# Altium footprint library UWRT_Footprint_Library_2020.PcbLib: 376 footprints (part 23 of 24)
Each footprint in its own frame and in the unit in brackets; x right, y up, seen from the top. Pads: shape width x height; smd on the part's side, far side on the other; paste and mask are expansions set on the pad; w line width, h text height; cw(c..) or ccw(c..) is an arc to the next point about the centre after c.
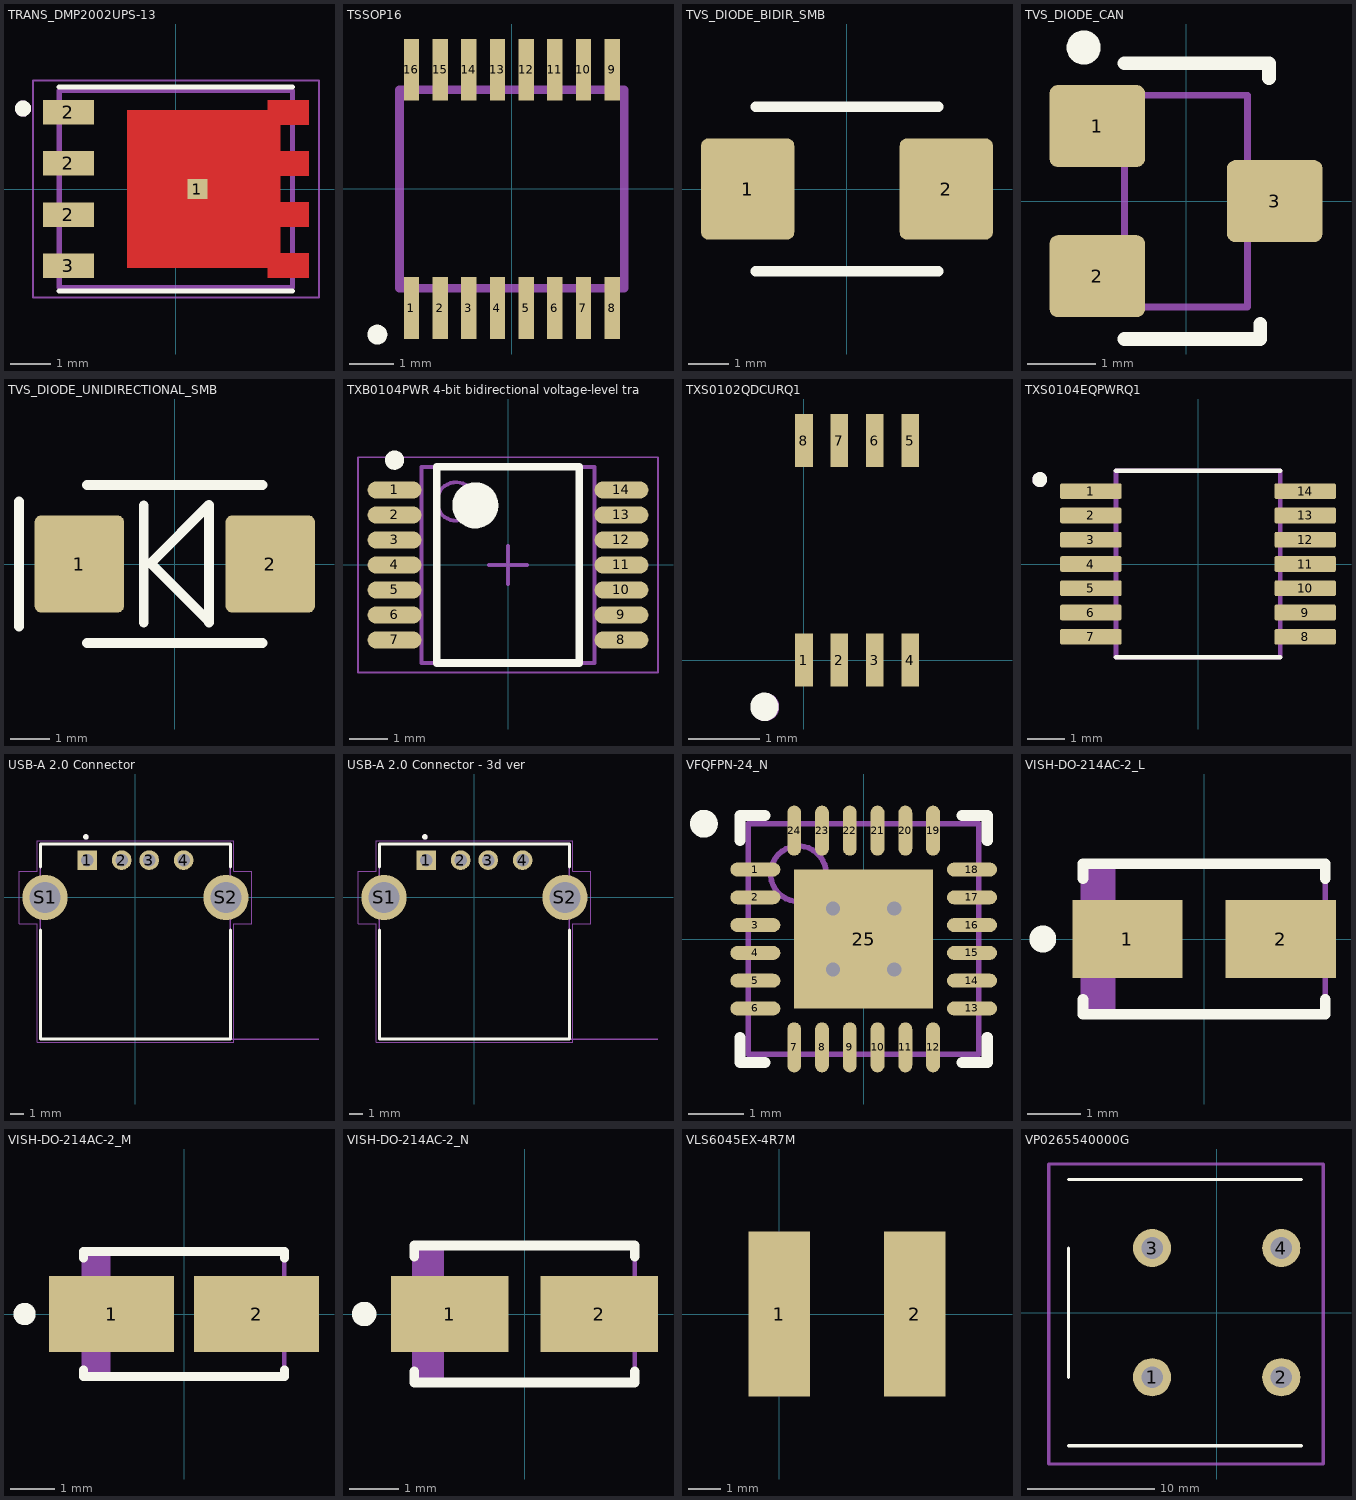
[diagram p22: the footprints below, top view; thin cyan lines are the x and y axes]

## TRANS_DMP2002UPS-13 [mm]
pads (5):
  rect 0.5x0.5 smd paste-1 mask+0: 1(0.535,0)
  rect 1.27x0.61 smd: 2(-2.67,-0.635) 2(-2.67,0.635) 2(-2.67,1.905) 3(-2.67,-1.905)
Top Layer:
  region: 3.305,1.6 2.595,1.6 2.595,0.94 3.305,0.94 3.305,0.33 2.595,0.33 2.595,-0.33 3.305,-0.33 3.305,-0.94 2.595,-0.94 2.595,-1.6 3.305,-1.6 3.305,-2.21 2.285,-2.21 2.285,-1.955 -1.215,-1.955 -1.215,1.955 2.285,1.955 2.285,2.21 3.305,2.21
Top Overlay:
  circle w0.2: c-3.8,2 r0.1
  lines w0.127: -2.9,-2.53 2.9,-2.53 ; -2.9,2.53 2.9,2.53
Top Paste:
  region: 1.64,-1.235 -0.57,-1.235 -0.57,1.235 1.64,1.235
  region: 3.305,1.6 2.6,1.6 2.6,2.21 3.305,2.21
  region: 3.305,0.33 2.6,0.33 2.6,0.94 3.305,0.94
  region: 3.305,-0.94 2.6,-0.94 2.6,-0.33 3.305,-0.33
  region: 3.305,-2.21 2.6,-2.21 2.6,-1.6 3.305,-1.6
Top Solder:
  region: 3.405,1.5 2.695,1.5 2.695,1.04 3.405,1.04 3.405,0.23 2.695,0.23 2.695,-0.23 3.405,-0.23 3.405,-1.04 2.695,-1.04 2.695,-1.5 3.405,-1.5 3.405,-2.31 2.185,-2.31 2.185,-2.055 -1.315,-2.055 -1.315,2.055 2.185,2.055 2.185,2.31 3.405,2.31
Mechanical 13:
  circle w0.2: c-3.8,2 r0.1
  lines w0.127: -2.9,-2.45 -2.9,2.45 2.9,2.45 2.9,-2.45 -2.9,-2.45
Mechanical 15:
  lines w0.05: -3.555,-2.7 3.555,-2.7 3.555,2.7 -3.555,2.7 -3.555,-2.7
3D body "SOIC8_SG_4P9X3P9MC.step": height 1.75, standoff 0, extent -3.048,-2.451 3.15,2.451

## TSSOP16 [mm]
pads (16):
  rect 0.35x1.4 smd: 1(-2.275,-2.7) 2(-1.625,-2.7) 3(-0.975,-2.7) 4(-0.325,-2.7) 5(0.325,-2.7) 6(0.975,-2.7) 7(1.625,-2.7) 8(2.275,-2.7) 9(2.275,2.7) 10(1.625,2.7) 11(0.975,2.7) 12(0.325,2.7) 13(-0.325,2.7) 14(-0.975,2.7) 15(-1.625,2.7) 16(-2.275,2.7)
Top Overlay:
  circle w0.25: c-3.048,-3.302 r0.1
Mechanical 7:
  lines w0.2: -2.55,-2.25 2.55,-2.25 2.55,2.25 -2.55,2.25 -2.55,-2.25
3D body "TSSOP16.STEP": height 1.1, standoff 0, extent -2.5,-3.203 2.5,3.203

## TVS_DIODE_BIDIR_SMB [mm] "DO-214AA, SMB"
pads (2):
  rrect15% 2.3x2.5 smd: 1(-2.45,0) 2(2.45,0)
Top Overlay:
  lines w0.254: -2.25,-2.032 2.25,-2.032 ; -2.25,2.032 2.25,2.032
3D body "User Library-DO-214AA SMB.STEP": height 2.27, standoff -0.03, extent -2.7,-1.8 2.7,1.8

## TVS_DIODE_CAN [mm] "SOT23, 3-Leads, Body 2.95x2.80mm, Pitch 0.95mm, IPC Low Density"
height 1.25
pads (3):
  rrect20% 1.4x1.2 smd: 1(-1.3,1.1) 2(-1.3,-1.1) 3(1.3,0)
Top Overlay:
  circle w0.25: c-1.5,2.25 r0.125
  lines w0.2: -0.9,-2.02 1.09,-2.02 1.09,-1.8 ; -0.9,2.02 1.217,2.02 1.217,1.8
Mechanical 13:
  lines w0.1: -0.9,-1.55 0.9,-1.55 0.9,1.55 -0.9,1.55 -0.9,-1.55
3D body "User Library-SOT23-3.step": height 1.3, standoff 0, extent -1.4,-1.45 1.4,1.45

## TVS_DIODE_UNIDIRECTIONAL_SMB [mm] "SMBJ26A"
pads (2):
  rrect15% 2.3x2.5 smd: 1(-2.45,0) 2(2.45,0)
Top Overlay:
  lines w0.254: -4,-1.6 -4,1.6 ; -2.25,-2.032 2.25,-2.032 ; -2.25,2.032 2.25,2.032 ; -0.798,-1.5 -0.798,1.5 ; -0.599,0 0.878,-1.476 ; -0.599,0.043 0.878,1.519 ; 0.878,-1.5 0.878,1.5
3D body "User Library-DO-214AA SMB.STEP": height 2.27, standoff -0.03, extent -2.7,-1.8 2.7,1.8

## TXB0104PWR 4-bit bidirectional voltage-level translator [mm] "Voltage Level Translator Bidirectional 1 Circuit 4 Channel 100Mbps 14-TSSOP"
height 1.2
pads (14):
  oval 1.4x0.45 smd: 1(-2.95,1.95) 2(-2.95,1.3) 3(-2.95,0.65) 4(-2.95,0) 5(-2.95,-0.65) 6(-2.95,-1.3) 7(-2.95,-1.95) 8(2.95,-1.95) 9(2.95,-1.3) 10(2.95,-0.65) 11(2.95,0) 12(2.95,0.65) 13(2.95,1.3) 14(2.95,1.95)
Top Overlay:
  circle w0.25: c-2.95,2.725 r0.125
  circle w0.6: c-0.85,1.55 r0.3
  lines w0.2: -1.85,-2.55 -1.85,2.55 1.85,2.55 1.85,-2.55 -1.85,-2.55
Mechanical 13:
  circle w0.1: c-1.35,1.65 r0.5
  lines w0.1: -2.25,-2.55 -2.25,2.55 2.25,2.55 2.25,-2.55 -2.25,-2.55
Mechanical 15:
  lines w0.05: -3.9,-2.8 -3.9,2.8 3.9,2.8 3.9,-2.8 -3.9,-2.8
  lines w0.1: -0.5,0 0.5,0 ; 0,-0.5 0,0.5
3D body: height 1.2, standoff 0.25, extent -2.75,-2.55 1.75,2.55

## TXS0102QDCURQ1 [mm]
pads (8):
  rect 0.25x0.75 smd: 1(0,0) 2(0.5,0) 3(1,0) 4(1.5,0) 5(1.5,3.1) 6(1,3.1) 7(0.5,3.1) 8(0,3.1)
Top Overlay:
  circle w0.2: c-0.559,-0.66 r0.1
Mechanical 13:
  circle w0.2: c-0.549,-0.663 r0.1
3D body "8-VSSOP.STEP": height 0.9, standoff 0, extent -0.288,0.102 1.812,3.2

## TXS0104EQPWRQ1 [mm]
pads (14):
  rrect25% 1.65x0.425 smd: 1(-2.87,1.95) 2(-2.87,1.3) 3(-2.87,0.65) 4(-2.87,0) 5(-2.87,-0.65) 6(-2.87,-1.3) 7(-2.87,-1.95) 8(2.87,-1.95) 9(2.87,-1.3) 10(2.87,-0.65) 11(2.87,0) 12(2.87,0.65) 13(2.87,1.3) 14(2.87,1.95)
Top Overlay:
  circle w0.2: c-4.24,2.26 r0.1
  lines w0.127: -2.2,-2.5 2.2,-2.5 ; -2.2,2.5 2.2,2.5
Mechanical 13:
  circle w0.2: c-4.24,2.26 r0.1
  lines w0.127: -2.2,-2.5 -2.2,2.5 2.2,2.5 2.2,-2.5 -2.2,-2.5
3D body "PW0014A.stp": height 1.13, standoff 0, extent -3.2,-2.5 3.2,2.5

## USB-A 2.0 Connector [mm]
pads (6):
  rect 1.428x1.428 hole 0.92: 1(-3.5,2.71)
  round 1.428 hole 0.92: 2(-1,2.71) 3(1,2.71) 4(3.5,2.71)
  round 3.276 hole 2.26: S1(-6.57,0) S2(6.57,0)
Top Overlay:
  circle w0.2: c-3.6,4.4 r0.1
  lines w0.2: -6.9,-2.37 -6.9,-10.28 6.9,-10.28 6.9,-2.37 ; -6.9,2.22 -6.9,3.88 6.9,3.88 6.9,2.22
Mechanical 13:
  circle w0.2: c-3.6,4.4 r0.1
  lines w0.1: 13.33,-10.28 6.9,-10.28 ; 6.9,-10.28 -6.9,-10.28 -6.9,3.88 6.9,3.88 6.9,-10.28
  text "PCB EDGE" at 7.45,-10 h0.81
Mechanical 15:
  lines w0.05: -8.46,-1.9 -8.46,1.9 -7.15,1.9 -7.15,4.13 7.15,4.13 7.15,1.9 8.46,1.9 8.46,-1.9 7.15,-1.9 7.15,-10.53 -7.15,-10.53 -7.15,-1.9 -8.46,-1.9
3D body "USB1130-15-A--3DModel-STEP-1.STEP": height 6.99, standoff -3.22, extent -7.799,-10.28 7.799,3.88

## USB-A 2.0 Connector - 3d ver [mm]
pads (6):
  rect 1.428x1.428 hole 0.92: 1(-3.5,2.71)
  round 1.428 hole 0.92: 2(-1,2.71) 3(1,2.71) 4(3.5,2.71)
  round 3.276 hole 2.26: S1(-6.57,0) S2(6.57,0)
Top Overlay:
  circle w0.2: c-3.6,4.4 r0.1
  lines w0.2: -6.9,-2.37 -6.9,-10.28 6.9,-10.28 6.9,-2.37 ; -6.9,2.22 -6.9,3.88 6.9,3.88 6.9,2.22
Mechanical 13:
  circle w0.2: c-3.6,4.4 r0.1
  lines w0.1: 13.33,-10.28 6.9,-10.28 ; 6.9,-10.28 -6.9,-10.28 -6.9,3.88 6.9,3.88 6.9,-10.28
  text "PCB EDGE" at 7.45,-10 h0.81
Mechanical 15:
  lines w0.05: -8.46,-1.9 -8.46,1.9 -7.15,1.9 -7.15,4.13 7.15,4.13 7.15,1.9 8.46,1.9 8.46,-1.9 7.15,-1.9 7.15,-10.53 -7.15,-10.53 -7.15,-1.9 -8.46,-1.9
3D body "USB1130-15-A--3DModel-STEP-1.STEP": height 6.99, standoff -3.22, extent -7.799,-10.28 7.799,3.88

## VFQFPN-24_N [mm] "QFN, 24-Leads, Body 4x4mm, Pitch 0.5mm, Thermal Pad 2.5x2.5mm, IPC Medium Density"
height 1
pads (25):
  oval 0.9x0.25 smd: 1(-1.95,1.25) 2(-1.95,0.75) 3(-1.95,0.25) 4(-1.95,-0.25) 5(-1.95,-0.75) 6(-1.95,-1.25) 13(1.95,-1.25) 14(1.95,-0.75) 15(1.95,-0.25) 16(1.95,0.25) 17(1.95,0.75) 18(1.95,1.25)
  oval 0.25x0.9 smd: 7(-1.25,-1.95) 8(-0.75,-1.95) 9(-0.25,-1.95) 10(0.25,-1.95) 11(0.75,-1.95) 12(1.25,-1.95) 19(1.25,1.95) 20(0.75,1.95) 21(0.25,1.95) 22(-0.25,1.95) 23(-0.75,1.95) 24(-1.25,1.95)
  rect 2.5x2.5 smd: 25(0,0)
via -0.55,0.55 diameter 0.508 hole 0.254
via 0.55,0.55 diameter 0.508 hole 0.254
via -0.55,-0.55 diameter 0.508 hole 0.254
via 0.55,-0.55 diameter 0.508 hole 0.254
Top Overlay:
  circle w0.25: c-2.875,2.075 r0.125
  lines w0.2: -2.225,-1.775 -2.225,-2.225 -1.775,-2.225 ; -2.225,1.775 -2.225,2.225 -1.775,2.225 ; 1.775,-2.225 2.225,-2.225 2.225,-1.775 ; 1.775,2.225 2.225,2.225 2.225,1.775
Mechanical 13:
  circle w0.1: c-1.175,1.175 r0.5
  lines w0.1: -2.075,-2.075 -2.075,2.075 2.075,2.075 2.075,-2.075 -2.075,-2.075
3D body: height 1, standoff 0, extent -2.075,-2.075 2.075,2.075

## VISH-DO-214AC-2_L [mm] "DO-214AC, 2-Leads, Body 4.5x2.79mm, IPC High Density"
height 2.29
pads (2):
  rect 2.05x1.45 smd: 1(-1.425,0) 2(1.425,0)
Top Overlay:
  circle w0.25: c-3,0 r0.125
  lines w0.2: -2.25,-1.125 -2.25,-1.4 2.25,-1.4 2.25,-1.125 ; -2.25,1.125 -2.25,1.4 2.25,1.4 2.25,1.125
Mechanical 13:
  rectangle: -2.25,-1.395 -1.645,1.395
  lines w0.1: -2.25,-1.395 2.25,-1.395 2.25,1.395 -2.25,1.395 -2.25,-1.395
3D body: height 2.29, standoff 0, extent -2.25,-1.395 2.25,1.395

## VISH-DO-214AC-2_M [mm] "DO-214AC, 2-Leads, Body 4.5x2.79mm, IPC Low Density"
height 2.29
pads (2):
  rect 2.8x1.7 smd: 1(-1.625,0) 2(1.625,0)
Top Overlay:
  circle w0.25: c-3.575,0 r0.125
  lines w0.2: -2.25,-1.25 -2.25,-1.4 2.25,-1.4 2.25,-1.25 ; -2.25,1.25 -2.25,1.4 2.25,1.4 2.25,1.25
Mechanical 13:
  rectangle: -2.25,-1.395 -1.645,1.395
  lines w0.1: -2.25,-1.395 -2.25,1.395 2.25,1.395 2.25,-1.395 -2.25,-1.395
3D body: height 2.29, standoff 0, extent -2.25,-1.395 2.25,1.395

## VISH-DO-214AC-2_N [mm] "DO-214AC, 2-Leads, Body 4.5x2.79mm, IPC Medium Density"
height 2.29
pads (2):
  rect 2.4x1.55 smd: 1(-1.525,0) 2(1.525,0)
Top Overlay:
  circle w0.25: c-3.275,0 r0.125
  lines w0.2: -2.25,-1.175 -2.25,-1.4 2.25,-1.4 2.25,-1.175 ; -2.25,1.175 -2.25,1.4 2.25,1.4 2.25,1.175
Mechanical 13:
  rectangle: -2.25,-1.395 -1.645,1.395
  lines w0.1: -2.25,-1.395 -2.25,1.395 2.25,1.395 2.25,-1.395 -2.25,-1.395
3D body: height 2.29, standoff 0, extent -2.25,-1.395 2.25,1.395

## VLS6045EX-4R7M [mm]
pads (2):
  rect 1.9x5.1 smd: 1(0,0) 2(4.2,0)
3D body "vls6045ex.step": height 4.5, standoff 0, extent -0.968,-3 5.032,3

## VP0265540000G [mm] "TERM BLK 2P SIDE ENT 10.16MM PCB"
pads (4):
  round 3 hole 1.7: 1(-5.08,-5.08) 2(5.08,-5.08) 3(-5.08,5.08) 4(5.08,5.08)
Top Overlay:
  lines w0.254: -11.65,-10.46 6.65,-10.46 ; -11.65,-5.08 -11.65,0 -11.65,5.08 ; -11.65,10.46 6.65,10.46
Mechanical 15:
  lines w0.254: -13.208,-11.9 8.382,-11.9 8.382,11.684 -13.208,11.684 -13.208,-11.9
3D body "VP0265540000G--3DModel-STEP-269445.STEP": height 28.5, standoff -4.6, extent -11.65,-10.46 6.65,10.46